# Altium footprint library lib.PcbLib: 145 footprints (part 9 of 10)
Each footprint in its own frame and in the unit in brackets; x right, y up, seen from the top. Pads: shape width x height; smd on the part's side, far side on the other; paste and mask are expansions set on the pad; w line width, h text height; cw(c..) or ccw(c..) is an arc to the next point about the centre after c.
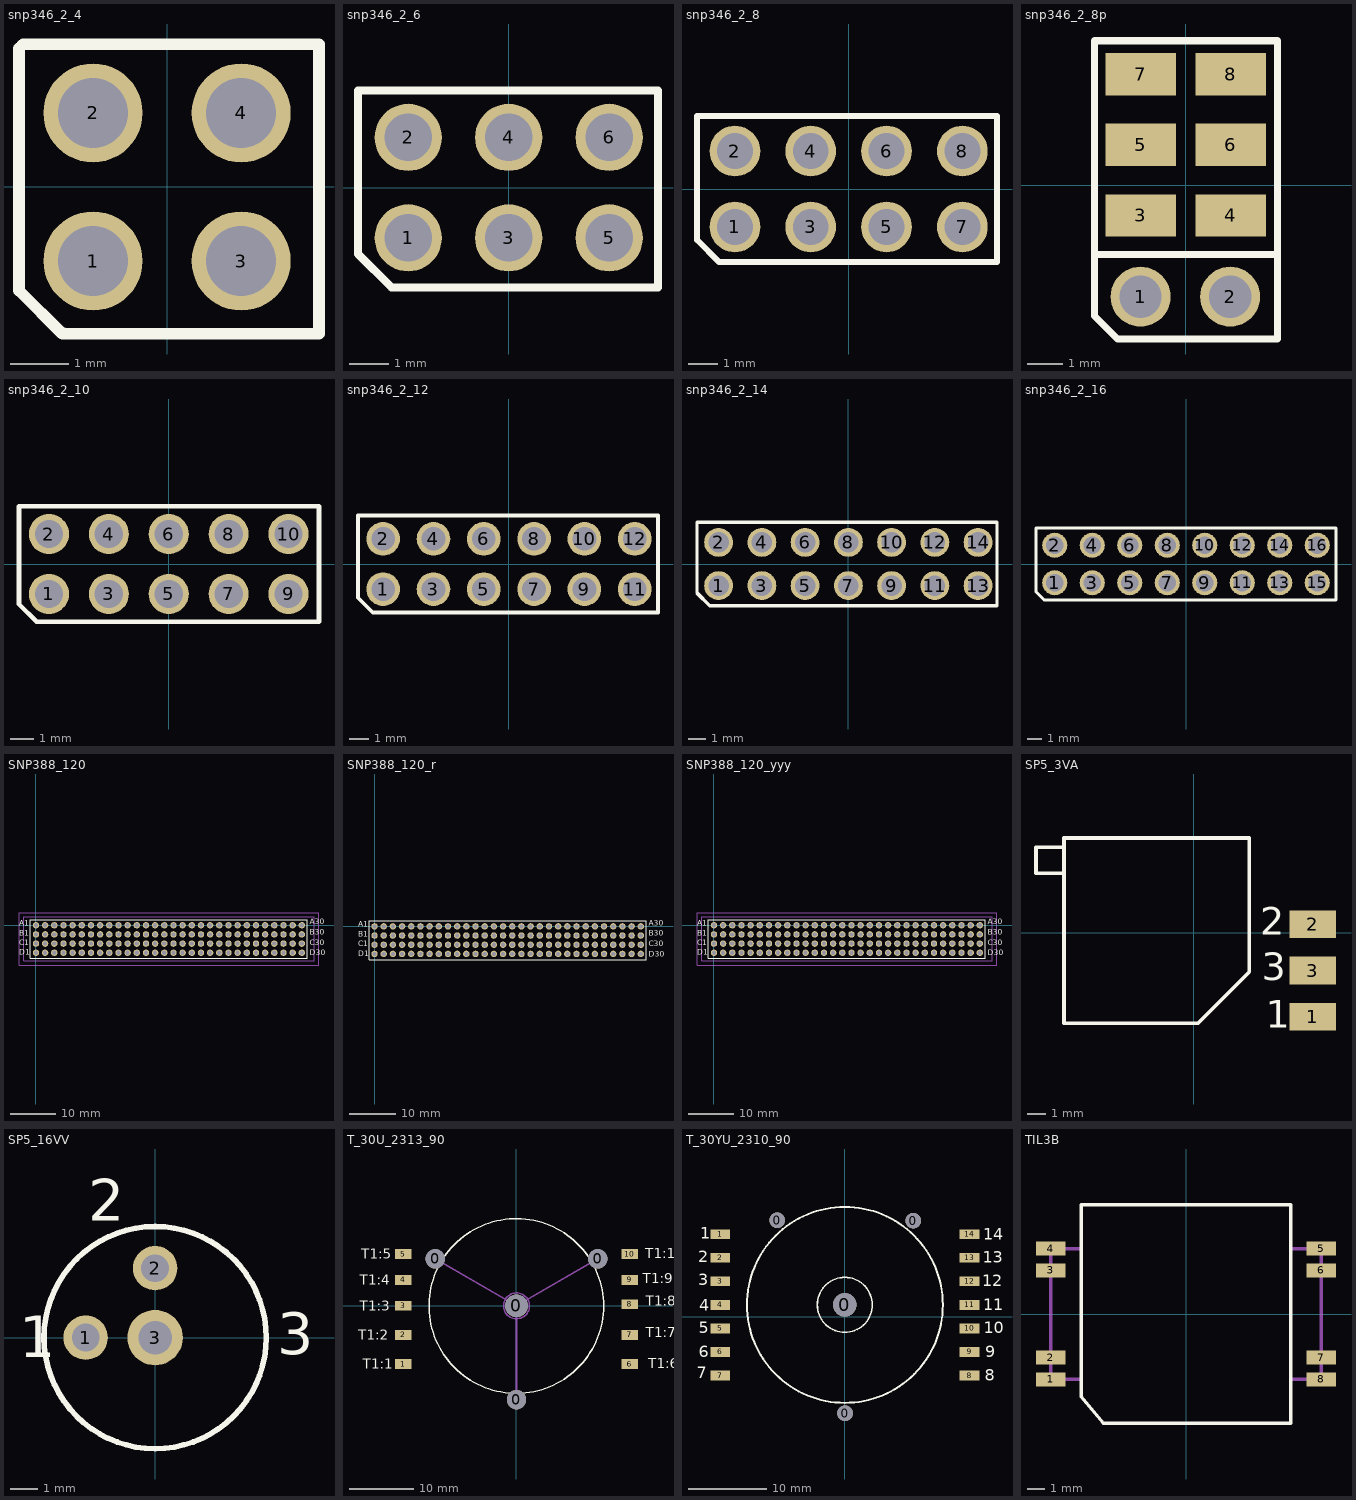
[diagram p8: the footprints below, top view; thin cyan lines are the x and y axes]

## snp346_2_4 [mm]
height 8.8
pads (4):
  round 1.7 hole 1.2: 1(-1.27,-1.27) 2(-1.27,1.27) 3(1.27,-1.27) 4(1.27,1.27)
Top Overlay:
  lines w0.2: -2.54,-1.77 -2.54,-1.775 ; -1.795,-2.52 -2.54,-1.775 ; -1.795,-2.5 -1.775,-2.52 2.605,-2.52 2.605,2.45 -2.465,2.45 -2.54,2.375 -2.54,-1.775
Mechanical 25:
  text "3" at 0.98,-3.77 h2
  text "4" at 1.23,2.73 h2
  text "1" at -1.52,-3.77 h2
  text "2" at -1.52,2.73 h2
3D body: height 2.6, standoff 0, extent -2.55,-2.525 2.65,2.375
3D body: height 6.2, standoff 0, extent -1.75,-1.75 -0.75,-0.75
3D body: height 6.2, standoff 0, extent 0.75,-1.775 1.75,-0.775
3D body: height 6.2, standoff 0, extent 0.75,0.75 1.75,1.75
3D body: height 6.2, standoff 0, extent -1.75,0.725 -0.75,1.725

## snp346_2_6 [mm]
height 8.8
pads (6):
  round 1.7 hole 1.2: 1(-2.54,-1.27) 2(-2.54,1.27) 3(0,-1.27) 4(0,1.27) 5(2.54,-1.27) 6(2.54,1.27)
Top Overlay:
  lines w0.2: -3.81,-1.675 -2.965,-2.52 3.773,-2.52 3.773,2.45 -3.81,2.45 -3.81,-1.675
Mechanical 25:
  text "5" at 3.435,-1.595 h2
  text "6" at 3.485,0.93 h2
  text "1" at -4.065,-1.645 h2
  text "2" at -4.315,0.855 h2
3D body: height 6.2, standoff 0, extent 2.05,0.775 3.05,1.775
3D body: height 6.2, standoff 0, extent 2.05,-1.775 3.05,-0.775
3D body: height 2.6, standoff 0, extent -3.85,-2.5 3.775,2.4
3D body: height 6.2, standoff 0, extent -3.05,-1.725 -2.05,-0.725
3D body: height 6.2, standoff 0, extent -0.55,-1.75 0.45,-0.75
3D body: height 6.2, standoff 0, extent -0.55,0.775 0.45,1.775
3D body: height 6.2, standoff 0, extent -3.05,0.75 -2.05,1.75

## snp346_2_8 [mm]
height 8.8
pads (8):
  round 1.7 hole 1.2: 1(-3.81,-1.27) 2(-3.81,1.27) 3(-1.27,-1.27) 4(-1.27,1.27) 5(1.27,-1.27) 6(1.27,1.27) 7(3.81,-1.27) 8(3.81,1.27)
Top Overlay:
  lines w0.2: -5.08,-1.704 -4.334,-2.45 4.97,-2.45 4.97,2.45 -5.08,2.45 -5.08,-1.704
Mechanical 25:
  text "1" at -5.26,-1.855 h2
  text "2" at -5.36,0.845 h2
  text "8" at 4.9,0.9 h1.5
  text "7" at 5.1,-1.7 h1.5
3D body: height 2.6, standoff 0, extent -5.085,-2.45 4.97,2.45
3D body: height 6.2, standoff 0, extent -4.285,-1.675 -3.285,-0.675
3D body: height 6.2, standoff 0, extent -1.785,-1.7 -0.785,-0.7
3D body: height 6.2, standoff 0, extent -1.785,0.825 -0.785,1.825
3D body: height 6.2, standoff 0, extent -4.285,0.8 -3.285,1.8
3D body: height 6.2, standoff 0, extent 0.79,0.8 1.79,1.8
3D body: height 6.2, standoff 0, extent 3.29,0.825 4.29,1.825
3D body: height 6.2, standoff 0, extent 3.29,-1.7 4.29,-0.7
3D body: height 6.2, standoff 0, extent 0.79,-1.675 1.79,-0.675

## snp346_2_8p [mm]
height 8.8
pads (8):
  round 1.7 hole 1.2: 1(-1.275,-3.15) 2(1.265,-3.15)
  rect 2x1.2 smd: 3(-1.275,-0.85) 4(1.275,-0.85) 5(-1.275,1.15) 6(1.275,1.15) 7(-1.275,3.15) 8(1.275,3.15)
Top Overlay:
  lines w0.2: -2.575,-3.7 -1.925,-4.35 2.6,-4.35 2.6,4.1 -2.575,4.1 -2.575,-3.65 ; -2.575,-1.95 2.565,-1.95
Mechanical 25:
  text "7" at -3.275,2.7 h2
  text "8" at 2.525,2.775 h2
  text "1" at -3.025,-3.7 h2
  text "2" at 2.275,-3.55 h2
3D body: height 0.25, standoff 0, extent 0.175,-1.55 2.375,-0.15
3D body: height 0.25, standoff 0, extent 0.175,0.45 2.375,1.85
3D body: height 0.25, standoff 0, extent 0.175,2.45 2.375,3.85
3D body: height 0.25, standoff 0, extent -2.35,2.45 -0.15,3.85
3D body: height 0.25, standoff 0, extent -2.375,0.45 -0.175,1.85
3D body: height 0.25, standoff 0, extent -2.375,-1.55 -0.175,-0.15
3D body: height 2.6, standoff 0, extent -2.575,-4.375 2.6,-2.05
3D body: height 6.2, standoff 0, extent -1.775,-3.6 -0.775,-2.6
3D body: height 6.2, standoff 0, extent 0.725,-3.625 1.725,-2.625

## snp346_2_10 [mm]
height 8.8
pads (10):
  round 1.7 hole 1.2: 1(-5.08,-1.27) 2(-5.08,1.27) 3(-2.54,-1.27) 4(-2.54,1.27) 5(0,-1.27) 6(0,1.27) 7(2.54,-1.27) 8(2.54,1.27) 9(5.08,-1.27) 10(5.08,1.27)
Top Overlay:
  lines w0.2: -6.35,-1.704 -6.35,2.45 6.37,2.45 6.37,-2.45 -5.604,-2.45 -6.35,-1.704
Mechanical 25:
  text "9" at 6.79,-1.75 h1.5
  text "10" at 6.29,1 h1.5
  text "2" at -6.63,0.845 h2
  text "1" at -6.53,-1.855 h2
3D body: height 6.2, standoff 0, extent -0.48,-1.675 0.52,-0.675
3D body: height 6.2, standoff 0, extent 2.02,-1.7 3.02,-0.7
3D body: height 6.2, standoff 0, extent 2.02,0.825 3.02,1.825
3D body: height 6.2, standoff 0, extent -0.48,0.8 0.52,1.8
3D body: height 6.2, standoff 0, extent 4.62,0.75 5.62,1.75
3D body: height 6.2, standoff 0, extent 4.62,-1.725 5.62,-0.725
3D body: height 6.2, standoff 0, extent -5.555,0.8 -4.555,1.8
3D body: height 6.2, standoff 0, extent -3.055,0.825 -2.055,1.825
3D body: height 6.2, standoff 0, extent -3.055,-1.7 -2.055,-0.7
3D body: height 6.2, standoff 0, extent -5.555,-1.675 -4.555,-0.675
3D body: height 2.6, standoff 0, extent -6.355,-2.45 6.345,2.45

## snp346_2_12 [mm]
height 8.8
pads (12):
  round 1.7 hole 1.2: 1(-6.35,-1.27) 2(-6.35,1.27) 3(-3.81,-1.27) 4(-3.81,1.27) 5(-1.27,-1.27) 6(-1.27,1.27) 7(1.27,-1.27) 8(1.27,1.27) 9(3.81,-1.27) 10(3.81,1.27) 11(6.35,-1.27) 12(6.35,1.27)
Top Overlay:
  lines w0.2: -7.62,-1.704 -6.874,-2.45 7.525,-2.45 7.525,2.45 -7.62,2.45 -7.62,-1.704
Mechanical 25:
  text "12" at 7.375,0.75 h2
  text "11" at 7.15,-1.73 h2
  text "1" at -7.8,-1.855 h2
  text "2" at -7.9,0.845 h2
3D body: height 2.6, standoff 0, extent -7.625,-2.45 7.525,2.45
3D body: height 6.2, standoff 0, extent -6.825,-1.675 -5.825,-0.675
3D body: height 6.2, standoff 0, extent -4.325,-1.7 -3.325,-0.7
3D body: height 6.2, standoff 0, extent -4.325,0.825 -3.325,1.825
3D body: height 6.2, standoff 0, extent -6.825,0.8 -5.825,1.8
3D body: height 6.2, standoff 0, extent 3.35,-1.725 4.35,-0.725
3D body: height 6.2, standoff 0, extent 5.85,-1.75 6.85,-0.75
3D body: height 6.2, standoff 0, extent 5.85,0.775 6.85,1.775
3D body: height 6.2, standoff 0, extent 3.35,0.75 4.35,1.75
3D body: height 6.2, standoff 0, extent -1.75,0.8 -0.75,1.8
3D body: height 6.2, standoff 0, extent 0.75,0.825 1.75,1.825
3D body: height 6.2, standoff 0, extent 0.75,-1.7 1.75,-0.7
3D body: height 6.2, standoff 0, extent -1.75,-1.675 -0.75,-0.675

## snp346_2_14 [mm]
height 8.8
pads (14):
  round 1.7 hole 1.2: 1(-7.62,-1.27) 2(-7.62,1.27) 3(-5.08,-1.27) 4(-5.08,1.27) 5(-2.54,-1.27) 6(-2.54,1.27) 7(0,-1.27) 8(0,1.27) 9(2.54,-1.27) 10(2.54,1.27) 11(5.08,-1.27) 12(5.08,1.27) 13(7.62,-1.27) 14(7.62,1.27)
Top Overlay:
  lines w0.2: -8.89,-1.704 -8.144,-2.45 8.73,-2.45 8.73,2.45 -8.89,2.45 -8.89,-1.704
Mechanical 25:
  text "14" at 8.73,0.75 h2
  text "13" at 8.73,-1.75 h2
  text "1" at -9.07,-1.855 h2
  text "2" at -9.17,0.845 h2
3D body: height 6.2, standoff 0, extent 7.125,0.75 8.125,1.75
3D body: height 6.2, standoff 0, extent 7.125,-1.75 8.125,-0.75
3D body: height 2.6, standoff 0, extent -8.895,-2.45 8.705,2.45
3D body: height 6.2, standoff 0, extent -8.095,-1.675 -7.095,-0.675
3D body: height 6.2, standoff 0, extent -5.595,-1.7 -4.595,-0.7
3D body: height 6.2, standoff 0, extent -5.595,0.825 -4.595,1.825
3D body: height 6.2, standoff 0, extent -8.095,0.8 -7.095,1.8
3D body: height 6.2, standoff 0, extent 2.08,-1.725 3.08,-0.725
3D body: height 6.2, standoff 0, extent 4.58,-1.75 5.58,-0.75
3D body: height 6.2, standoff 0, extent 4.58,0.775 5.58,1.775
3D body: height 6.2, standoff 0, extent 2.08,0.75 3.08,1.75
3D body: height 6.2, standoff 0, extent -3.02,0.8 -2.02,1.8
3D body: height 6.2, standoff 0, extent -0.52,0.825 0.48,1.825
3D body: height 6.2, standoff 0, extent -0.52,-1.7 0.48,-0.7
3D body: height 6.2, standoff 0, extent -3.02,-1.675 -2.02,-0.675

## snp346_2_16 [mm] "massa 0.96"
height 8.8
pads (16):
  round 1.7 hole 1.2: 1(-8.89,-1.27) 2(-8.89,1.27) 3(-6.35,-1.27) 4(-6.35,1.27) 5(-3.81,-1.27) 6(-3.81,1.27) 7(-1.27,-1.27) 8(-1.27,1.27) 9(1.27,-1.27) 10(1.27,1.27) 11(3.81,-1.27) 12(3.81,1.27) 13(6.35,-1.27) 14(6.35,1.27) 15(8.89,-1.27) 16(8.89,1.27)
Top Overlay:
  lines w0.2: -10.16,-1.87 -10.16,-1.88 ; -10.16,-1.88 -10.16,2.45 10.16,2.45 10.16,-2.45 -9.59,-2.45 ; -10.16,-1.88 -9.59,-2.45 ; -10.16,-1.88 -9.59,-2.45
Mechanical 25:
  text "2" at -10.922,0.762 h2
  text "1" at -10.922,-2.286 h2
  text "16" at 10.168,0.762 h2
  text "15" at 10.168,-1.778 h2

## SNP388_120 [mm] "переходник с кожухом m=21g"
height 9.6
pads (120):
  round 1.4 hole 0.9: 1(0,0) 2(2,0) 3(4,0) 4(6,0) 5(8,0) 6(10,0) 7(12,0) 8(14,0) 9(16,0) 10(18,0) 11(20,0) 12(22,0) 13(24,0) 14(26,0) 15(28,0) 16(30,0) 17(32,0) 18(34,0) 19(36,0) 20(38,0) 21(40,0) 22(42,0) 23(44,0) 24(46,0) 25(48,0) 26(50,0) 27(52,0) 28(54,0) 29(56,0) 30(58,0) 31(0,-2) 32(2,-2) 33(4,-2) 34(6,-2) 35(8,-2) 36(10,-2) 37(12,-2) 38(14,-2) 39(16,-2) 40(18,-2) 41(20,-2) 42(22,-2) 43(24,-2) 44(26,-2) 45(28,-2) 46(30,-2) 47(32,-2) 48(34,-2) 49(36,-2) 50(38,-2) 51(40,-2) 52(42,-2) 53(44,-2) 54(46,-2) 55(48,-2) 56(50,-2) 57(52,-2) 58(54,-2) 59(56,-2) 60(58,-2) 61(0,-4) 62(2,-4) 63(4,-4) 64(6,-4) 65(8,-4) 66(10,-4) 67(12,-4) 68(14,-4) 69(16,-4) 70(18,-4) 71(20,-4) 72(22,-4) 73(24,-4) 74(26,-4) 75(28,-4) 76(30,-4) 77(32,-4) 78(34,-4) 79(36,-4) 80(38,-4) 81(40,-4) 82(42,-4) 83(44,-4) 84(46,-4) 85(48,-4) 86(50,-4) 87(52,-4) 88(54,-4) 89(56,-4) 90(58,-4) 91(0,-6) 92(2,-6) 93(4,-6) 94(6,-6) 95(8,-6) 96(10,-6) 97(12,-6) 98(14,-6) 99(16,-6) 100(18,-6) 101(20,-6) 102(22,-6) 103(24,-6) 104(26,-6) 105(28,-6) 106(30,-6) 107(32,-6) 108(34,-6) 109(36,-6) 110(38,-6) 111(40,-6) 112(42,-6) 113(44,-6) 114(46,-6) 115(48,-6) 116(50,-6) 117(52,-6) 118(54,-6) 119(56,-6) 120(58,-6)
Top Overlay:
  lines w0.2: -1.2,-7.25 -1.2,1.25 59.2,1.25 59.2,-7.25 -1.2,-7.25
  text "D1" at -3.6,-6.9 h2
  text "B1" at -3.6,-2.7 h2
  text "A1" at -3.602,-0.5 h2
  text "C1" at -3.6,-4.8 h2
  text "D30" at 59.75,-7 h2
  text "B30" at 59.75,-2.5 h2
  text "A30" at 59.748,-0.25 h2
  text "C30" at 59.75,-4.75 h2
Mechanical 6:
  lines w0.2: -3.7,-8.7 61.7,-8.7 61.7,2.7 -3.7,2.7 -3.7,-8.7 ; -2.7,-7.7 -2.7,1.8 60.7,1.8 60.7,-7.7 -2.7,-7.7
Mechanical 25:
  text "C30" at 59.75,-4.75 h2
  text "A30" at 59.748,-0.25 h2
  text "B30" at 59.75,-2.5 h2
  text "D30" at 59.75,-7 h2
  text "C1" at -3.05,-4.75 h2
  text "A1" at -3.042,-0.5 h2
  text "B1" at -2.907,-2.75 h2
  text "D1" at -3,-6.75 h2
3D body "pc_104_kpc120sr060tan.stp": height 9.35, standoff -15.84, extent -3.161,-8.655 61.139,2.645

## SNP388_120_r [mm] "розетка m=12g"
height 9.6
pads (120):
  round 1.4 hole 0.9: 1(0,0) 2(2,0) 3(4,0) 4(6,0) 5(8,0) 6(10,0) 7(12,0) 8(14,0) 9(16,0) 10(18,0) 11(20,0) 12(22,0) 13(24,0) 14(26,0) 15(28,0) 16(30,0) 17(32,0) 18(34,0) 19(36,0) 20(38,0) 21(40,0) 22(42,0) 23(44,0) 24(46,0) 25(48,0) 26(50,0) 27(52,0) 28(54,0) 29(56,0) 30(58,0) 31(0,-2) 32(2,-2) 33(4,-2) 34(6,-2) 35(8,-2) 36(10,-2) 37(12,-2) 38(14,-2) 39(16,-2) 40(18,-2) 41(20,-2) 42(22,-2) 43(24,-2) 44(26,-2) 45(28,-2) 46(30,-2) 47(32,-2) 48(34,-2) 49(36,-2) 50(38,-2) 51(40,-2) 52(42,-2) 53(44,-2) 54(46,-2) 55(48,-2) 56(50,-2) 57(52,-2) 58(54,-2) 59(56,-2) 60(58,-2) 61(0,-4) 62(2,-4) 63(4,-4) 64(6,-4) 65(8,-4) 66(10,-4) 67(12,-4) 68(14,-4) 69(16,-4) 70(18,-4) 71(20,-4) 72(22,-4) 73(24,-4) 74(26,-4) 75(28,-4) 76(30,-4) 77(32,-4) 78(34,-4) 79(36,-4) 80(38,-4) 81(40,-4) 82(42,-4) 83(44,-4) 84(46,-4) 85(48,-4) 86(50,-4) 87(52,-4) 88(54,-4) 89(56,-4) 90(58,-4) 91(0,-6) 92(2,-6) 93(4,-6) 94(6,-6) 95(8,-6) 96(10,-6) 97(12,-6) 98(14,-6) 99(16,-6) 100(18,-6) 101(20,-6) 102(22,-6) 103(24,-6) 104(26,-6) 105(28,-6) 106(30,-6) 107(32,-6) 108(34,-6) 109(36,-6) 110(38,-6) 111(40,-6) 112(42,-6) 113(44,-6) 114(46,-6) 115(48,-6) 116(50,-6) 117(52,-6) 118(54,-6) 119(56,-6) 120(58,-6)
Top Overlay:
  lines w0.2: -1.2,-7.25 -1.2,1.25 59.2,1.25 59.2,-7.25 -1.2,-7.25
  text "D1" at -3.6,-6.9 h2
  text "B1" at -3.6,-2.7 h2
  text "A1" at -3.602,-0.5 h2
  text "C1" at -3.6,-4.8 h2
  text "D30" at 59.75,-7 h2
  text "B30" at 59.75,-2.5 h2
  text "A30" at 59.748,-0.25 h2
  text "C30" at 59.75,-4.75 h2
Mechanical 25:
  text "C30" at 59.75,-4.75 h2
  text "A30" at 59.748,-0.25 h2
  text "B30" at 59.75,-2.5 h2
  text "D30" at 59.75,-7 h2
  text "C1" at -3.05,-4.75 h2
  text "A1" at -3.042,-0.5 h2
  text "B1" at -2.907,-2.75 h2
  text "D1" at -3,-6.75 h2
3D body: height 9.6, standoff 0, extent -1.2,-7.2 59.2,1.2

## SNP388_120_yyy [mm]
height 9.6
pads (120):
  round 1.4 hole 0.9: 1(0,0) 2(2,0) 3(4,0) 4(6,0) 5(8,0) 6(10,0) 7(12,0) 8(14,0) 9(16,0) 10(18,0) 11(20,0) 12(22,0) 13(24,0) 14(26,0) 15(28,0) 16(30,0) 17(32,0) 18(34,0) 19(36,0) 20(38,0) 21(40,0) 22(42,0) 23(44,0) 24(46,0) 25(48,0) 26(50,0) 27(52,0) 28(54,0) 29(56,0) 30(58,0) 31(0,-2) 32(2,-2) 33(4,-2) 34(6,-2) 35(8,-2) 36(10,-2) 37(12,-2) 38(14,-2) 39(16,-2) 40(18,-2) 41(20,-2) 42(22,-2) 43(24,-2) 44(26,-2) 45(28,-2) 46(30,-2) 47(32,-2) 48(34,-2) 49(36,-2) 50(38,-2) 51(40,-2) 52(42,-2) 53(44,-2) 54(46,-2) 55(48,-2) 56(50,-2) 57(52,-2) 58(54,-2) 59(56,-2) 60(58,-2) 61(0,-4) 62(2,-4) 63(4,-4) 64(6,-4) 65(8,-4) 66(10,-4) 67(12,-4) 68(14,-4) 69(16,-4) 70(18,-4) 71(20,-4) 72(22,-4) 73(24,-4) 74(26,-4) 75(28,-4) 76(30,-4) 77(32,-4) 78(34,-4) 79(36,-4) 80(38,-4) 81(40,-4) 82(42,-4) 83(44,-4) 84(46,-4) 85(48,-4) 86(50,-4) 87(52,-4) 88(54,-4) 89(56,-4) 90(58,-4) 91(0,-6) 92(2,-6) 93(4,-6) 94(6,-6) 95(8,-6) 96(10,-6) 97(12,-6) 98(14,-6) 99(16,-6) 100(18,-6) 101(20,-6) 102(22,-6) 103(24,-6) 104(26,-6) 105(28,-6) 106(30,-6) 107(32,-6) 108(34,-6) 109(36,-6) 110(38,-6) 111(40,-6) 112(42,-6) 113(44,-6) 114(46,-6) 115(48,-6) 116(50,-6) 117(52,-6) 118(54,-6) 119(56,-6) 120(58,-6)
Top Overlay:
  lines w0.2: -1.2,-7.25 59.2,-7.25 59.2,1.25 -1.2,1.25 -1.2,-7.25
  text "C30" at 59.75,-4.75 h2
  text "A30" at 59.748,-0.25 h2
  text "B30" at 59.75,-2.5 h2
  text "D30" at 59.75,-7 h2
  text "C1" at -3.6,-4.8 h2
  text "A1" at -3.602,-0.5 h2
  text "B1" at -3.6,-2.7 h2
  text "D1" at -3.6,-6.9 h2
Mechanical 6:
  lines w0.2: -3.7,-8.7 -3.7,2.7 61.7,2.7 61.7,-8.7 -3.7,-8.7 ; -2.7,-7.7 60.7,-7.7 60.7,1.8 -2.7,1.8 -2.7,-7.7
Mechanical 25:
  text "D1" at -3,-6.75 h2
  text "B1" at -2.907,-2.75 h2
  text "A1" at -3.042,-0.5 h2
  text "C1" at -3.05,-4.75 h2
  text "D30" at 59.75,-7 h2
  text "B30" at 59.75,-2.5 h2
  text "A30" at 59.748,-0.25 h2
  text "C30" at 59.75,-4.75 h2

## SP5_3VA [mm]
height 5.4
pads (3):
  rect 2.5x1.5 smd: 1(6.413,-4.525) 2(6.413,0.475) 3(6.413,-2.025)
Top Overlay:
  lines w0.2: -7.125,4.625 -8.525,4.625 -8.525,3.225 -7.025,3.225 ; -7.012,-4.875 0.212,-4.875 2.988,-2.1 2.988,5.125 -7.012,5.125 -7.012,-4.875
  text "1" at 3.863,-5.125 h1.5
  text "2" at 3.563,-0.1 h1.5
  text "3" at 3.663,-2.55 h1.5
Mechanical 25:
  text "3" at 3.588,-2.525 h2
  text "1" at 3.813,-5.1 h2
  text "2" at 3.488,-0.125 h2

## SP5_16VV [mm] "massa 1"
height 6.2
pads (3):
  round 1.6 hole 1: 1(-2.5,0) 2(0,2.5)
  round 2 hole 1.2: 3(0,0)
Top Overlay:
  circle w0.2: c0,0 r4
  text "3" at 4.4,-0.6 h1.5
  text "2" at -2.4,4.2 h1.5
  text "1" at -4.9,-0.7 h1.5
Mechanical 25:
  text "1" at -4.4,-0.3 h2
  text "2" at -0.4,3.6 h2
  text "3" at 1.5,-0.3 h2

## T_30U_2313_90 [mm] "30g"
height 13.5
pads (14):
  round 3 hole 3 unplated: 0(-12.56,7.25) 0(0,-14.5) 0(12.56,7.25)
  round 3.5 hole 3.5 unplated: 0(0,0)
  rect 2.5x1.5 smd: 1(-17.5,-9) 2(-17.5,-4.5) 3(-17.5,0) 4(-17.5,4) 5(-17.5,8) 6(17.5,-9) 7(17.5,-4.5) 8(17.5,0.25) 9(17.5,4) 10(17.5,8)
Top Overlay:
  circle w0.2: c-0.025,-0.025 r13.5
  text "T1:7" at 20,-4.875 h1.5
  text "T1:10" at 19.875,7.375 h1.5
  text "T1:6" at 20.375,-9.625 h1.5
  text "T1:5" at -24,7.25 h1.5
  text "T1:9" at 19.5,3.5 h1.5
  text "T1:8" at 20,0 h1.5
  text "T1:4" at -24.25,3.25 h1.5
  text "T1:1" at -23.75,-9.75 h1.5
  text "T1:3" at -24.25,-0.75 h1.5
  text "T1:2" at -24.5,-5.25 h1.5
Mechanical 5:
  circle w0.2: c0,0 r2
  lines w0.25: -12.56,7.25 0,0 ; 0,-14.5 0,0 ; 12.56,7.25 0,0
Mechanical 6:
  lines w0.25: -12.535,7.275 0.025,0.025 ; 0.025,-14.475 0.025,0.025 ; 12.585,7.275 0.025,0.025
Mechanical 25:
  text "T1:5" at -22.75,7.5 h2
  text "T1:6" at 19.75,-9.5 h2
  text "T1:10" at 19.5,7.5 h2
  text "T1:7" at 19.5,-5.25 h2
  text "T1:9" at 19.25,3.5 h2
  text "T1:8" at 19.5,-0.25 h2
  text "T1:4" at -22.75,3.25 h2
  text "T1:1" at -23,-10 h2
  text "T1:3" at -22.75,-0.5 h2
  text "T1:2" at -22.75,-5.25 h2

## T_30YU_2310_90 [mm]
pads (18):
  round 2 hole 2 unplated: 0(-8.625,12.288) 0(0.025,-12.287) 0(8.7,12.238)
  round 3 hole 3 unplated: 0(0,1.513)
  rect 2.5x1.25 smd: 1(-15.875,10.513) 2(-15.875,7.513) 3(-15.875,4.513) 4(-15.875,1.513) 5(-15.875,-1.487) 6(-15.875,-4.487) 7(-15.875,-7.487) 8(15.875,-7.487) 9(15.875,-4.487) 10(15.875,-1.487) 11(15.875,1.513) 12(15.875,4.513) 13(15.875,7.513) 14(15.875,10.513)
Top Overlay:
  circle w0.2: c0,1.513 r3.5
  circle w0.254: c0,1.513 r12.475
  text "6" at -18.6,-5.15 h1.5
  text "7" at -18.825,-7.85 h1.5
  text "5" at -18.625,-2.125 h1.5
  text "4" at -18.55,0.75 h1.5
  text "3" at -18.675,4.025 h1.5
  text "2" at -18.675,6.95 h1.5
  text "1" at -18.4,9.925 h1.5
  text "14" at 17.6,9.825 h1.5
  text "13" at 17.575,6.9 h1.5
  text "12" at 17.5,3.9 h1.5
  text "11" at 17.6,0.85 h1.5
  text "10" at 17.675,-2.1 h1.5
  text "9" at 17.875,-5.175 h1.5
  text "8" at 17.8,-8.175 h1.5
Mechanical 25:
  text "8" at 13.475,-8.025 h2
  text "9" at 13.525,-5.1 h2
  text "11" at 12.825,0.925 h2
  text "10" at 12.65,-2.125 h2
  text "13" at 12.675,6.875 h2
  text "12" at 12.725,3.875 h2
  text "14" at 12.6,9.85 h2
  text "7" at -14.125,-8.125 h2
  text "6" at -14.15,-5.15 h2
  text "5" at -14.175,-2.175 h2
  text "4" at -14.25,0.875 h2
  text "1" at -13.975,9.85 h2
  text "3" at -14.25,3.75 h2
  text "2" at -14.2,6.85 h2

## TIL3B [mm]
height 6.5
pads (8):
  rect 1.7x0.8 smd: 1(-7.75,-3.75) 2(-7.75,-2.5) 3(-7.75,2.5) 4(-7.75,3.75) 5(7.75,3.75) 6(7.75,2.5) 7(7.75,-2.5) 8(7.75,-3.75)
Top Overlay:
  lines w0.2: -6,-4.75 -4.75,-6.25 ; -6,-4.7 -6,6.25 6,6.25 6,-6.25 -4.65,-6.25
Mechanical 5:
  lines w0.2: -6,-3.75 -7.75,-3.75 -7.75,3.75 -6,3.75 ; 6,-3.75 7.75,-3.75 7.75,3.75 6,3.75
Mechanical 25:
  text "8" at 5.775,-4.375 h2
  text "5" at 5.875,3.05 h2
  text "4" at -6.65,3.325 h2
  text "1" at -6.525,-4.375 h2
3D body "TIL6B.stp": height 6.98, standoff -0.02, extent -7.95,-6.25 7.95,6.25